# Altium footprint library WallLight.PcbLib: 33 footprints (part 3 of 3)
Each footprint in its own frame and in the unit in brackets; x right, y up, seen from the top. Pads: shape width x height; smd on the part's side, far side on the other; paste and mask are expansions set on the pad; w line width, h text height; cw(c..) or ccw(c..) is an arc to the next point about the centre after c.
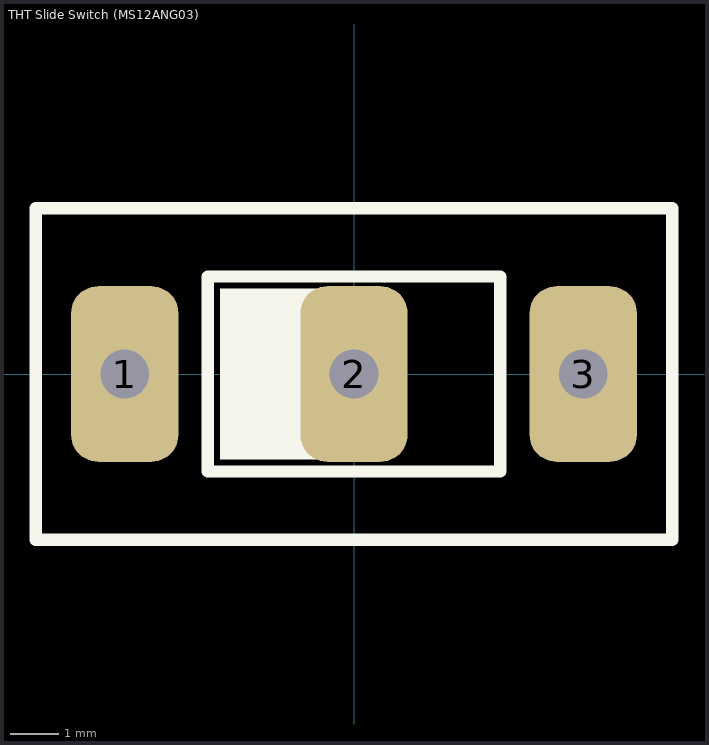
[diagram p2: the footprint, top view; thin cyan lines are the x and y axes]

## THT Slide Switch (MS12ANG03) [mm]
pads (3):
  rrect50% 2.2x3.6 hole 1 square: 1(-4.7,0) 2(0,0) 3(4.7,0)
Top Overlay:
  region: 0.75,1.75 -2.75,1.75 -2.75,-1.75 0.75,-1.75
  lines w0.254: -6.525,-3.4 -6.525,0 -6.525,3.4 0,3.4 6.525,3.4 6.525,0 6.525,-3.4 0,-3.4 -6.525,-3.4 ; -3,-2 -3,0 -3,2 0,2 3,2 3,0 3,-2 0,-2 -3,-2
3D body "SS-12D10L4.x_t": height 10.22, standoff -2.58, extent -6.525,-3.4 6.475,3.4